# Altium schematic symbol library jlcpcb_2025_04_capacitors_extended_0402.schlib: 3594 symbols (part 9 of 20) (continued)
## CC0402KRX7R5BB104
designator C?  Capacitance: 100nF  (hidden comment: *)
Capacitor, Ceramic (MLCC), 100nF, ±10%, 6.3V, X7R, ±10%, SMD 0402; Manufacturer: YAGEO; Manufacturer Part Number: CC0402KRX7R5BB104; Package Size: 0402; JLCPCB Basic Part: No; JLCPCB Part Number: C541406; Supplier 1: LCSC; Category: Capacitors - MLCC; Supplier Part Number 1: C541406; Tolerance: ±10%; Voltage Rating: 6.3V; Temperature Coefficient: X7R; RoHS: Yes; ComponentLink1Description: Datasheet; ComponentLink1URL: https://wmsc.lcsc.com/wmsc/upload/file/pdf/v2/lcsc/2006151134_YAGEO-CC0402KRX7R5BB104_C541406.pdf; ComponentLink2Description: JLCPCB Part URL; ComponentLink2URL: https://jlcpcb.com/partdetail/C541406; ComponentLink3Description: LCSC Part URL; ComponentLink3URL: https://lcsc.com/product-detail/Multilayer-Ceramic-Capacitors-MLCC---SMD-SMT_YAGEO-YAGEO-CC0402KRX7R5BB104_C541406.html
footprint CAP-0402 (0402 (1005M) Capacitor)
pins: 1, 2

## CC0402KRX7R5BB105
designator C?  Capacitance: 1uF  (hidden comment: *)
Capacitor, Ceramic (MLCC), 1uF, ±10%, 6.3V, X7R, ±10%, SMD 0402; Manufacturer: YAGEO; Manufacturer Part Number: CC0402KRX7R5BB105; Package Size: 0402; JLCPCB Basic Part: No; JLCPCB Part Number: C115046; Supplier 1: LCSC; Category: Capacitors - MLCC; Supplier Part Number 1: C115046; Tolerance: ±10%; Voltage Rating: 6.3V; Temperature Coefficient: X7R; RoHS: Yes; ComponentLink1Description: Datasheet; ComponentLink1URL: https://wmsc.lcsc.com/wmsc/upload/file/pdf/v2/lcsc/2007151105_YAGEO-CC0402KRX7R5BB105_C115046.pdf; ComponentLink2Description: JLCPCB Part URL; ComponentLink2URL: https://jlcpcb.com/partdetail/C115046; ComponentLink3Description: LCSC Part URL; ComponentLink3URL: https://lcsc.com/product-detail/Multilayer-Ceramic-Capacitors-MLCC---SMD-SMT_YAGEO-YAGEO-CC0402KRX7R5BB105_C115046.html
footprint CAP-0402 (0402 (1005M) Capacitor)
pins: 1, 2

## CC0402KRX7R5BB474
designator C?  Capacitance: 470nF  (hidden comment: *)
Capacitor, Ceramic (MLCC), 470nF, ±10%, 6.3V, X7R, ±10%, SMD 0402; Manufacturer: YAGEO; Manufacturer Part Number: CC0402KRX7R5BB474; Package Size: 0402; JLCPCB Basic Part: No; JLCPCB Part Number: C2960663; Supplier 1: LCSC; Category: Capacitors - MLCC; Supplier Part Number 1: C2960663; Tolerance: ±10%; Voltage Rating: 6.3V; Temperature Coefficient: X7R; RoHS: Yes; ComponentLink1Description: Datasheet; ComponentLink1URL: https://wmsc.lcsc.com/wmsc/upload/file/pdf/v2/lcsc/2201201730_YAGEO-CC0402KRX7R5BB474_C2960663.pdf; ComponentLink2Description: JLCPCB Part URL; ComponentLink2URL: https://jlcpcb.com/partdetail/C2960663; ComponentLink3Description: LCSC Part URL; ComponentLink3URL: https://lcsc.com/product-detail/Multilayer-Ceramic-Capacitors-MLCC---SMD-SMT_YAGEO-YAGEO-CC0402KRX7R5BB474_C2960663.html
footprint CAP-0402 (0402 (1005M) Capacitor)
pins: 1, 2

## CC0402KRX7R6BB103
designator C?  Capacitance: 10nF  (hidden comment: *)
Capacitor, Ceramic (MLCC), 10nF, ±10%, 10V, X7R, ±10%, SMD 0402; Manufacturer: YAGEO; Manufacturer Part Number: CC0402KRX7R6BB103; Package Size: 0402; JLCPCB Basic Part: No; JLCPCB Part Number: C541371; Supplier 1: LCSC; Category: Capacitors - MLCC; Supplier Part Number 1: C541371; Tolerance: ±10%; Voltage Rating: 10V; Temperature Coefficient: X7R; RoHS: Yes; ComponentLink1Description: Datasheet; ComponentLink1URL: https://wmsc.lcsc.com/wmsc/upload/file/pdf/v2/lcsc/2006151112_YAGEO-CC0402KRX7R6BB103_C541371.pdf; ComponentLink2Description: JLCPCB Part URL; ComponentLink2URL: https://jlcpcb.com/partdetail/C541371; ComponentLink3Description: LCSC Part URL; ComponentLink3URL: https://lcsc.com/product-detail/Multilayer-Ceramic-Capacitors-MLCC---SMD-SMT_YAGEO-YAGEO-CC0402KRX7R6BB103_C541371.html
footprint CAP-0402 (0402 (1005M) Capacitor)
pins: 1, 2

## CC0402KRX7R6BB104
designator C?  Capacitance: 100nF  (hidden comment: *)
Capacitor, Ceramic (MLCC), 100nF, ±10%, 10V, X7R, ±10%, SMD 0402; Manufacturer: YAGEO; Manufacturer Part Number: CC0402KRX7R6BB104; Package Size: 0402; JLCPCB Basic Part: No; JLCPCB Part Number: C309458; Supplier 1: LCSC; Category: Capacitors - MLCC; Supplier Part Number 1: C309458; Tolerance: ±10%; Voltage Rating: 10V; Temperature Coefficient: X7R; RoHS: Yes; ComponentLink1Description: Datasheet; ComponentLink1URL: https://wmsc.lcsc.com/wmsc/upload/file/pdf/v2/lcsc/2304140030_YAGEO-CC0402KRX7R6BB104_C309458.pdf; ComponentLink2Description: JLCPCB Part URL; ComponentLink2URL: https://jlcpcb.com/partdetail/C309458; ComponentLink3Description: LCSC Part URL; ComponentLink3URL: https://lcsc.com/product-detail/Multilayer-Ceramic-Capacitors-MLCC---SMD-SMT_YAGEO-YAGEO-CC0402KRX7R6BB104_C309458.html
footprint CAP-0402 (0402 (1005M) Capacitor)
pins: 1, 2

## CC0402KRX7R6BB105
designator C?  Capacitance: 1uF  (hidden comment: *)
Capacitor, Ceramic (MLCC), 1uF, ±10%, 10V, X7R, ±10%, SMD 0402; Manufacturer: YAGEO; Manufacturer Part Number: CC0402KRX7R6BB105; Package Size: 0402; JLCPCB Basic Part: No; JLCPCB Part Number: C7500381; Supplier 1: LCSC; Category: Capacitors - MLCC; Supplier Part Number 1: C7500381; Tolerance: ±10%; Voltage Rating: 10V; Temperature Coefficient: X7R; RoHS: Yes; ComponentLink1Description: Datasheet; ComponentLink1URL: https://wmsc.lcsc.com/wmsc/upload/file/pdf/v2/lcsc/2311211121_YAGEO-CC0402KRX7R6BB105_C7500381.pdf; ComponentLink2Description: JLCPCB Part URL; ComponentLink2URL: https://jlcpcb.com/partdetail/C7500381; ComponentLink3Description: LCSC Part URL; ComponentLink3URL: https://lcsc.com/product-detail/Multilayer-Ceramic-Capacitors-MLCC---SMD-SMT_YAGEO-YAGEO-CC0402KRX7R6BB105_C7500381.html
footprint CAP-0402 (0402 (1005M) Capacitor)
pins: 1, 2

## CC0402KRX7R6BB222
designator C?  Capacitance: 2.2nF  (hidden comment: *)
Capacitor, Ceramic (MLCC), 2.2nF, ±10%, 10V, X7R, ±10%, SMD 0402; Manufacturer: YAGEO; Manufacturer Part Number: CC0402KRX7R6BB222; Package Size: 0402; JLCPCB Basic Part: No; JLCPCB Part Number: C541373; Supplier 1: LCSC; Category: Capacitors - MLCC; Supplier Part Number 1: C541373; Tolerance: ±10%; Voltage Rating: 10V; Temperature Coefficient: X7R; RoHS: Yes; ComponentLink1Description: Datasheet; ComponentLink1URL: https://wmsc.lcsc.com/wmsc/upload/file/pdf/v2/lcsc/2006151112_YAGEO-CC0402KRX7R6BB222_C541373.pdf; ComponentLink2Description: JLCPCB Part URL; ComponentLink2URL: https://jlcpcb.com/partdetail/C541373; ComponentLink3Description: LCSC Part URL; ComponentLink3URL: https://lcsc.com/product-detail/Multilayer-Ceramic-Capacitors-MLCC---SMD-SMT_YAGEO-YAGEO-CC0402KRX7R6BB222_C541373.html
footprint CAP-0402 (0402 (1005M) Capacitor)
pins: 1, 2

## CC0402KRX7R6BB223
designator C?  Capacitance: 22nF  (hidden comment: *)
Capacitor, Ceramic (MLCC), 22nF, ±10%, 10V, X7R, ±10%, SMD 0402; Manufacturer: YAGEO; Manufacturer Part Number: CC0402KRX7R6BB223; Package Size: 0402; JLCPCB Basic Part: No; JLCPCB Part Number: C541403; Supplier 1: LCSC; Category: Capacitors - MLCC; Supplier Part Number 1: C541403; Tolerance: ±10%; Voltage Rating: 10V; Temperature Coefficient: X7R; RoHS: Yes; ComponentLink1Description: Datasheet; ComponentLink1URL: https://wmsc.lcsc.com/wmsc/upload/file/pdf/v2/lcsc/2006151133_YAGEO-CC0402KRX7R6BB223_C541403.pdf; ComponentLink2Description: JLCPCB Part URL; ComponentLink2URL: https://jlcpcb.com/partdetail/C541403; ComponentLink3Description: LCSC Part URL; ComponentLink3URL: https://lcsc.com/product-detail/Multilayer-Ceramic-Capacitors-MLCC---SMD-SMT_YAGEO-YAGEO-CC0402KRX7R6BB223_C541403.html
footprint CAP-0402 (0402 (1005M) Capacitor)
pins: 1, 2

## CC0402KRX7R6BB224
designator C?  Capacitance: 220nF  (hidden comment: *)
Capacitor, Ceramic (MLCC), 220nF, ±10%, 10V, X7R, ±10%, SMD 0402; Manufacturer: YAGEO; Manufacturer Part Number: CC0402KRX7R6BB224; Package Size: 0402; JLCPCB Basic Part: No; JLCPCB Part Number: C705052; Supplier 1: LCSC; Category: Capacitors - MLCC; Supplier Part Number 1: C705052; Tolerance: ±10%; Voltage Rating: 10V; Temperature Coefficient: X7R; RoHS: Yes; ComponentLink1Description: Datasheet; ComponentLink1URL: https://wmsc.lcsc.com/wmsc/upload/file/pdf/v2/lcsc/2007202033_YAGEO-CC0402KRX7R6BB224_C705052.pdf; ComponentLink2Description: JLCPCB Part URL; ComponentLink2URL: https://jlcpcb.com/partdetail/C705052; ComponentLink3Description: LCSC Part URL; ComponentLink3URL: https://lcsc.com/product-detail/Multilayer-Ceramic-Capacitors-MLCC---SMD-SMT_YAGEO-YAGEO-CC0402KRX7R6BB224_C705052.html
footprint CAP-0402 (0402 (1005M) Capacitor)
pins: 1, 2

## CC0402KRX7R6BB273
designator C?  Capacitance: 27nF  (hidden comment: *)
Capacitor, Ceramic (MLCC), 27nF, ±10%, 10V, X7R, ±10%, SMD 0402; Manufacturer: YAGEO; Manufacturer Part Number: CC0402KRX7R6BB273; Package Size: 0402; JLCPCB Basic Part: No; JLCPCB Part Number: C327166; Supplier 1: LCSC; Category: Capacitors - MLCC; Supplier Part Number 1: C327166; Tolerance: ±10%; Voltage Rating: 10V; Temperature Coefficient: X7R; RoHS: Yes; ComponentLink1Description: Datasheet; ComponentLink1URL: https://wmsc.lcsc.com/wmsc/upload/file/pdf/v2/lcsc/1811141225_YAGEO-CC0402KRX7R6BB273_C327166.pdf; ComponentLink2Description: JLCPCB Part URL; ComponentLink2URL: https://jlcpcb.com/partdetail/C327166; ComponentLink3Description: LCSC Part URL; ComponentLink3URL: https://lcsc.com/product-detail/Multilayer-Ceramic-Capacitors-MLCC---SMD-SMT_YAGEO-YAGEO-CC0402KRX7R6BB273_C327166.html
footprint CAP-0402 (0402 (1005M) Capacitor)
pins: 1, 2

## CC0402KRX7R6BB333
designator C?  Capacitance: 33nF  (hidden comment: *)
Capacitor, Ceramic (MLCC), 33nF, ±10%, 10V, X7R, ±10%, SMD 0402; Manufacturer: YAGEO; Manufacturer Part Number: CC0402KRX7R6BB333; Package Size: 0402; JLCPCB Basic Part: No; JLCPCB Part Number: C541404; Supplier 1: LCSC; Category: Capacitors - MLCC; Supplier Part Number 1: C541404; Tolerance: ±10%; Voltage Rating: 10V; Temperature Coefficient: X7R; RoHS: Yes; ComponentLink1Description: Datasheet; ComponentLink1URL: https://wmsc.lcsc.com/wmsc/upload/file/pdf/v2/lcsc/2006151133_YAGEO-CC0402KRX7R6BB333_C541404.pdf; ComponentLink2Description: JLCPCB Part URL; ComponentLink2URL: https://jlcpcb.com/partdetail/C541404; ComponentLink3Description: LCSC Part URL; ComponentLink3URL: https://lcsc.com/product-detail/Multilayer-Ceramic-Capacitors-MLCC---SMD-SMT_YAGEO-YAGEO-CC0402KRX7R6BB333_C541404.html
footprint CAP-0402 (0402 (1005M) Capacitor)
pins: 1, 2

## CC0402KRX7R6BB393
designator C?  Capacitance: 39nF  (hidden comment: *)
Capacitor, Ceramic (MLCC), 39nF, ±10%, 10V, X7R, ±10%, SMD 0402; Manufacturer: YAGEO; Manufacturer Part Number: CC0402KRX7R6BB393; Package Size: 0402; JLCPCB Basic Part: No; JLCPCB Part Number: C527015; Supplier 1: LCSC; Category: Capacitors - MLCC; Supplier Part Number 1: C527015; Tolerance: ±10%; Voltage Rating: 10V; Temperature Coefficient: X7R; RoHS: Yes; ComponentLink1Description: Datasheet; ComponentLink1URL: https://wmsc.lcsc.com/wmsc/upload/file/pdf/v2/lcsc/2006031835_YAGEO-CC0402KRX7R6BB393_C527015.pdf; ComponentLink2Description: JLCPCB Part URL; ComponentLink2URL: https://jlcpcb.com/partdetail/C527015; ComponentLink3Description: LCSC Part URL; ComponentLink3URL: https://lcsc.com/product-detail/Multilayer-Ceramic-Capacitors-MLCC---SMD-SMT_YAGEO-YAGEO-CC0402KRX7R6BB393_C527015.html
footprint CAP-0402 (0402 (1005M) Capacitor)
pins: 1, 2

## CC0402KRX7R6BB472
designator C?  Capacitance: 4.7nF  (hidden comment: *)
Capacitor, Ceramic (MLCC), 4.7nF, ±10%, 10V, X7R, ±10%, SMD 0402; Manufacturer: YAGEO; Manufacturer Part Number: CC0402KRX7R6BB472; Package Size: 0402; JLCPCB Basic Part: No; JLCPCB Part Number: C1852867; Supplier 1: LCSC; Category: Capacitors - MLCC; Supplier Part Number 1: C1852867; Tolerance: ±10%; Voltage Rating: 10V; Temperature Coefficient: X7R; RoHS: Yes; ComponentLink1Description: Datasheet; ComponentLink1URL: https://wmsc.lcsc.com/wmsc/upload/file/pdf/v2/lcsc/2201271000_YAGEO-CC0402KRX7R6BB472_C1852867.pdf; ComponentLink2Description: JLCPCB Part URL; ComponentLink2URL: https://jlcpcb.com/partdetail/C1852867; ComponentLink3Description: LCSC Part URL; ComponentLink3URL: https://lcsc.com/product-detail/Multilayer-Ceramic-Capacitors-MLCC---SMD-SMT_YAGEO-YAGEO-CC0402KRX7R6BB472_C1852867.html
footprint CAP-0402 (0402 (1005M) Capacitor)
pins: 1, 2

## CC0402KRX7R6BB473
designator C?  Capacitance: 47nF  (hidden comment: *)
Capacitor, Ceramic (MLCC), 47nF, ±10%, 10V, X7R, ±10%, SMD 0402; Manufacturer: YAGEO; Manufacturer Part Number: CC0402KRX7R6BB473; Package Size: 0402; JLCPCB Basic Part: No; JLCPCB Part Number: C327054; Supplier 1: LCSC; Category: Capacitors - MLCC; Supplier Part Number 1: C327054; Tolerance: ±10%; Voltage Rating: 10V; Temperature Coefficient: X7R; RoHS: Yes; ComponentLink1Description: Datasheet; ComponentLink1URL: https://wmsc.lcsc.com/wmsc/upload/file/pdf/v2/lcsc/1811141233_YAGEO-CC0402KRX7R6BB473_C327054.pdf; ComponentLink2Description: JLCPCB Part URL; ComponentLink2URL: https://jlcpcb.com/partdetail/C327054; ComponentLink3Description: LCSC Part URL; ComponentLink3URL: https://lcsc.com/product-detail/Multilayer-Ceramic-Capacitors-MLCC---SMD-SMT_YAGEO-YAGEO-CC0402KRX7R6BB473_C327054.html
footprint CAP-0402 (0402 (1005M) Capacitor)
pins: 1, 2

## CC0402KRX7R6BB474
designator C?  Capacitance: 470nF  (hidden comment: *)
Capacitor, Ceramic (MLCC), 470nF, ±10%, 10V, X7R, ±10%, SMD 0402; Manufacturer: YAGEO; Manufacturer Part Number: CC0402KRX7R6BB474; Package Size: 0402; JLCPCB Basic Part: No; JLCPCB Part Number: C723358; Supplier 1: LCSC; Category: Capacitors - MLCC; Supplier Part Number 1: C723358; Tolerance: ±10%; Voltage Rating: 10V; Temperature Coefficient: X7R; RoHS: Yes; ComponentLink1Description: Datasheet; ComponentLink1URL: https://wmsc.lcsc.com/wmsc/upload/file/pdf/v2/lcsc/2204291430_YAGEO-CC0402KRX7R6BB474_C723358.pdf; ComponentLink2Description: JLCPCB Part URL; ComponentLink2URL: https://jlcpcb.com/partdetail/C723358; ComponentLink3Description: LCSC Part URL; ComponentLink3URL: https://lcsc.com/product-detail/Multilayer-Ceramic-Capacitors-MLCC---SMD-SMT_YAGEO-YAGEO-CC0402KRX7R6BB474_C723358.html
footprint CAP-0402 (0402 (1005M) Capacitor)
pins: 1, 2

## CC0402KRX7R6BB563
designator C?  Capacitance: 56nF  (hidden comment: *)
Capacitor, Ceramic (MLCC), 56nF, ±10%, 10V, X7R, ±10%, SMD 0402; Manufacturer: YAGEO; Manufacturer Part Number: CC0402KRX7R6BB563; Package Size: 0402; JLCPCB Basic Part: No; JLCPCB Part Number: C576734; Supplier 1: LCSC; Category: Capacitors - MLCC; Supplier Part Number 1: C576734; Tolerance: ±10%; Voltage Rating: 10V; Temperature Coefficient: X7R; RoHS: Yes; ComponentLink1Description: Datasheet; ComponentLink1URL: https://wmsc.lcsc.com/wmsc/upload/file/pdf/v2/lcsc/2008171233_YAGEO-CC0402KRX7R6BB563_C576734.pdf; ComponentLink2Description: JLCPCB Part URL; ComponentLink2URL: https://jlcpcb.com/partdetail/C576734; ComponentLink3Description: LCSC Part URL; ComponentLink3URL: https://lcsc.com/product-detail/Multilayer-Ceramic-Capacitors-MLCC---SMD-SMT_YAGEO-YAGEO-CC0402KRX7R6BB563_C576734.html
footprint CAP-0402 (0402 (1005M) Capacitor)
pins: 1, 2

## CC0402KRX7R6BB683
designator C?  Capacitance: 68nF  (hidden comment: *)
Capacitor, Ceramic (MLCC), 68nF, ±10%, 10V, X7R, ±10%, SMD 0402; Manufacturer: YAGEO; Manufacturer Part Number: CC0402KRX7R6BB683; Package Size: 0402; JLCPCB Basic Part: No; JLCPCB Part Number: C107014; Supplier 1: LCSC; Category: Capacitors - MLCC; Supplier Part Number 1: C107014; Tolerance: ±10%; Voltage Rating: 10V; Temperature Coefficient: X7R; RoHS: Yes; ComponentLink1Description: Datasheet; ComponentLink1URL: https://wmsc.lcsc.com/wmsc/upload/file/pdf/v2/lcsc/2304140030_YAGEO-CC0402KRX7R6BB683_C107014.pdf; ComponentLink2Description: JLCPCB Part URL; ComponentLink2URL: https://jlcpcb.com/partdetail/C107014; ComponentLink3Description: LCSC Part URL; ComponentLink3URL: https://lcsc.com/product-detail/Multilayer-Ceramic-Capacitors-MLCC---SMD-SMT_YAGEO-YAGEO-CC0402KRX7R6BB683_C107014.html
footprint CAP-0402 (0402 (1005M) Capacitor)
pins: 1, 2

## CC0402KRX7R6BB823
designator C?  Capacitance: 82nF  (hidden comment: *)
Capacitor, Ceramic (MLCC), 82nF, ±10%, 10V, X7R, ±10%, SMD 0402; Manufacturer: YAGEO; Manufacturer Part Number: CC0402KRX7R6BB823; Package Size: 0402; JLCPCB Basic Part: No; JLCPCB Part Number: C277511; Supplier 1: LCSC; Category: Capacitors - MLCC; Supplier Part Number 1: C277511; Tolerance: ±10%; Voltage Rating: 10V; Temperature Coefficient: X7R; RoHS: Yes; ComponentLink1Description: Datasheet; ComponentLink1URL: https://wmsc.lcsc.com/wmsc/upload/file/pdf/v2/lcsc/2304140030_YAGEO-CC0402KRX7R6BB823_C277511.pdf; ComponentLink2Description: JLCPCB Part URL; ComponentLink2URL: https://jlcpcb.com/partdetail/C277511; ComponentLink3Description: LCSC Part URL; ComponentLink3URL: https://lcsc.com/product-detail/Multilayer-Ceramic-Capacitors-MLCC---SMD-SMT_YAGEO-YAGEO-CC0402KRX7R6BB823_C277511.html
footprint CAP-0402 (0402 (1005M) Capacitor)
pins: 1, 2

## CC0402KRX7R7BB101
designator C?  Capacitance: 100pF  (hidden comment: *)
Capacitor, Ceramic (MLCC), 100pF, ±10%, 16V, X7R, ±10%, SMD 0402; Manufacturer: YAGEO; Manufacturer Part Number: CC0402KRX7R7BB101; Package Size: 0402; JLCPCB Basic Part: No; JLCPCB Part Number: C541374; Supplier 1: LCSC; Category: Capacitors - MLCC; Supplier Part Number 1: C541374; Tolerance: ±10%; Voltage Rating: 16V; Temperature Coefficient: X7R; RoHS: Yes; ComponentLink1Description: Datasheet; ComponentLink1URL: https://wmsc.lcsc.com/wmsc/upload/file/pdf/v2/lcsc/2006151112_YAGEO-CC0402KRX7R7BB101_C541374.pdf; ComponentLink2Description: JLCPCB Part URL; ComponentLink2URL: https://jlcpcb.com/partdetail/C541374; ComponentLink3Description: LCSC Part URL; ComponentLink3URL: https://lcsc.com/product-detail/Multilayer-Ceramic-Capacitors-MLCC---SMD-SMT_YAGEO-YAGEO-CC0402KRX7R7BB101_C541374.html
footprint CAP-0402 (0402 (1005M) Capacitor)
pins: 1, 2

## CC0402KRX7R7BB102
designator C?  Capacitance: 1nF  (hidden comment: *)
Capacitor, Ceramic (MLCC), 1nF, ±10%, 16V, X7R, ±10%, SMD 0402; Manufacturer: YAGEO; Manufacturer Part Number: CC0402KRX7R7BB102; Package Size: 0402; JLCPCB Basic Part: No; JLCPCB Part Number: C189467; Supplier 1: LCSC; Category: Capacitors - MLCC; Supplier Part Number 1: C189467; Tolerance: ±10%; Voltage Rating: 16V; Temperature Coefficient: X7R; RoHS: Yes; ComponentLink1Description: Datasheet; ComponentLink1URL: https://wmsc.lcsc.com/wmsc/upload/file/pdf/v2/lcsc/1810241333_YAGEO-CC0402KRX7R7BB102_C189467.pdf; ComponentLink2Description: JLCPCB Part URL; ComponentLink2URL: https://jlcpcb.com/partdetail/C189467; ComponentLink3Description: LCSC Part URL; ComponentLink3URL: https://lcsc.com/product-detail/Multilayer-Ceramic-Capacitors-MLCC---SMD-SMT_YAGEO-YAGEO-CC0402KRX7R7BB102_C189467.html
footprint CAP-0402 (0402 (1005M) Capacitor)
pins: 1, 2

## CC0402KRX7R7BB103
designator C?  Capacitance: 10nF  (hidden comment: *)
Capacitor, Ceramic (MLCC), 10nF, ±10%, 16V, X7R, ±10%, SMD 0402; Manufacturer: YAGEO; Manufacturer Part Number: CC0402KRX7R7BB103; Package Size: 0402; JLCPCB Basic Part: No; JLCPCB Part Number: C327009; Supplier 1: LCSC; Category: Capacitors - MLCC; Supplier Part Number 1: C327009; Tolerance: ±10%; Voltage Rating: 16V; Temperature Coefficient: X7R; RoHS: Yes; ComponentLink1Description: Datasheet; ComponentLink1URL: https://wmsc.lcsc.com/wmsc/upload/file/pdf/v2/lcsc/1811141241_YAGEO-CC0402KRX7R7BB103_C327009.pdf; ComponentLink2Description: JLCPCB Part URL; ComponentLink2URL: https://jlcpcb.com/partdetail/C327009; ComponentLink3Description: LCSC Part URL; ComponentLink3URL: https://lcsc.com/product-detail/Multilayer-Ceramic-Capacitors-MLCC---SMD-SMT_YAGEO-YAGEO-CC0402KRX7R7BB103_C327009.html
footprint CAP-0402 (0402 (1005M) Capacitor)
pins: 1, 2

## CC0402KRX7R7BB104
designator C?  Capacitance: 100nF  (hidden comment: *)
Capacitor, Ceramic (MLCC), 100nF, ±10%, 16V, X7R, ±10%, SMD 0402; Manufacturer: YAGEO; Manufacturer Part Number: CC0402KRX7R7BB104; Package Size: 0402; JLCPCB Basic Part: No; JLCPCB Part Number: C60474; Supplier 1: LCSC; Category: Capacitors - MLCC; Supplier Part Number 1: C60474; Tolerance: ±10%; Voltage Rating: 16V; Temperature Coefficient: X7R; RoHS: Yes; ComponentLink1Description: Datasheet; ComponentLink1URL: https://wmsc.lcsc.com/wmsc/upload/file/pdf/v2/lcsc/2203221430_YAGEO-CC0402KRX7R7BB104_C60474.pdf; ComponentLink2Description: JLCPCB Part URL; ComponentLink2URL: https://jlcpcb.com/partdetail/C60474; ComponentLink3Description: LCSC Part URL; ComponentLink3URL: https://lcsc.com/product-detail/Multilayer-Ceramic-Capacitors-MLCC---SMD-SMT_YAGEO-YAGEO-CC0402KRX7R7BB104_C60474.html
footprint CAP-0402 (0402 (1005M) Capacitor)
pins: 1, 2

## CC0402KRX7R7BB123
designator C?  Capacitance: 12nF  (hidden comment: *)
Capacitor, Ceramic (MLCC), 12nF, ±10%, 16V, X7R, ±10%, SMD 0402; Manufacturer: YAGEO; Manufacturer Part Number: CC0402KRX7R7BB123; Package Size: 0402; JLCPCB Basic Part: No; JLCPCB Part Number: C113785; Supplier 1: LCSC; Category: Capacitors - MLCC; Supplier Part Number 1: C113785; Tolerance: ±10%; Voltage Rating: 16V; Temperature Coefficient: X7R; RoHS: Yes; ComponentLink1Description: Datasheet; ComponentLink1URL: https://wmsc.lcsc.com/wmsc/upload/file/pdf/v2/lcsc/2304140030_YAGEO-CC0402KRX7R7BB123_C113785.pdf; ComponentLink2Description: JLCPCB Part URL; ComponentLink2URL: https://jlcpcb.com/partdetail/C113785; ComponentLink3Description: LCSC Part URL; ComponentLink3URL: https://lcsc.com/product-detail/Multilayer-Ceramic-Capacitors-MLCC---SMD-SMT_YAGEO-YAGEO-CC0402KRX7R7BB123_C113785.html
footprint CAP-0402 (0402 (1005M) Capacitor)
pins: 1, 2

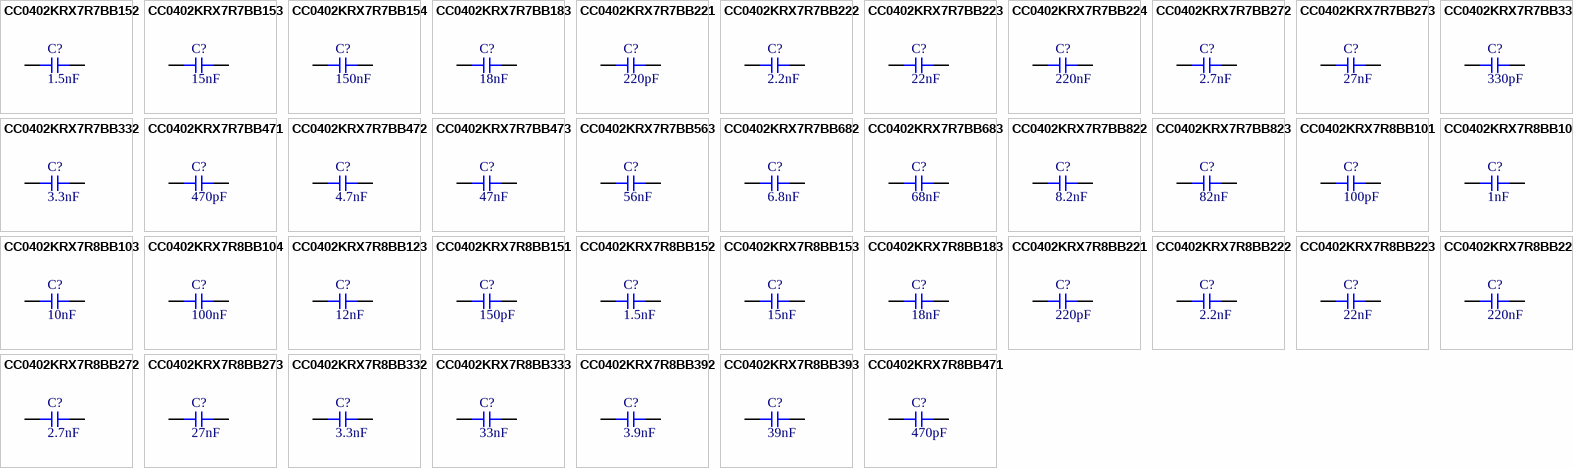
[diagram p39: symbols CC0402KRX7R7BB152 to CC0402KRX7R8BB471]

## CC0402KRX7R7BB152
designator C?  Capacitance: 1.5nF  (hidden comment: *)
Capacitor, Ceramic (MLCC), 1.5nF, ±10%, 16V, X7R, ±10%, SMD 0402; Manufacturer: YAGEO; Manufacturer Part Number: CC0402KRX7R7BB152; Package Size: 0402; JLCPCB Basic Part: No; JLCPCB Part Number: C541375; Supplier 1: LCSC; Category: Capacitors - MLCC; Supplier Part Number 1: C541375; Tolerance: ±10%; Voltage Rating: 16V; Temperature Coefficient: X7R; RoHS: Yes; ComponentLink1Description: Datasheet; ComponentLink1URL: https://wmsc.lcsc.com/wmsc/upload/file/pdf/v2/lcsc/2006151112_YAGEO-CC0402KRX7R7BB152_C541375.pdf; ComponentLink2Description: JLCPCB Part URL; ComponentLink2URL: https://jlcpcb.com/partdetail/C541375; ComponentLink3Description: LCSC Part URL; ComponentLink3URL: https://lcsc.com/product-detail/Multilayer-Ceramic-Capacitors-MLCC---SMD-SMT_YAGEO-YAGEO-CC0402KRX7R7BB152_C541375.html
footprint CAP-0402 (0402 (1005M) Capacitor)
pins: 1, 2

## CC0402KRX7R7BB153
designator C?  Capacitance: 15nF  (hidden comment: *)
Capacitor, Ceramic (MLCC), 15nF, ±10%, 16V, X7R, ±10%, SMD 0402; Manufacturer: YAGEO; Manufacturer Part Number: CC0402KRX7R7BB153; Package Size: 0402; JLCPCB Basic Part: No; JLCPCB Part Number: C107015; Supplier 1: LCSC; Category: Capacitors - MLCC; Supplier Part Number 1: C107015; Tolerance: ±10%; Voltage Rating: 16V; Temperature Coefficient: X7R; RoHS: Yes; ComponentLink1Description: Datasheet; ComponentLink1URL: https://wmsc.lcsc.com/wmsc/upload/file/pdf/v2/lcsc/2304140030_YAGEO-CC0402KRX7R7BB153_C107015.pdf; ComponentLink2Description: JLCPCB Part URL; ComponentLink2URL: https://jlcpcb.com/partdetail/C107015; ComponentLink3Description: LCSC Part URL; ComponentLink3URL: https://lcsc.com/product-detail/Multilayer-Ceramic-Capacitors-MLCC---SMD-SMT_YAGEO-YAGEO-CC0402KRX7R7BB153_C107015.html
footprint CAP-0402 (0402 (1005M) Capacitor)
pins: 1, 2

## CC0402KRX7R7BB154
designator C?  Capacitance: 150nF  (hidden comment: *)
Capacitor, Ceramic (MLCC), 150nF, ±10%, 16V, X7R, ±10%, SMD 0402; Manufacturer: YAGEO; Manufacturer Part Number: CC0402KRX7R7BB154; Package Size: 0402; JLCPCB Basic Part: No; JLCPCB Part Number: C505466; Supplier 1: LCSC; Category: Capacitors - MLCC; Supplier Part Number 1: C505466; Tolerance: ±10%; Voltage Rating: 16V; Temperature Coefficient: X7R; RoHS: Yes; ComponentLink1Description: Datasheet; ComponentLink1URL: https://wmsc.lcsc.com/wmsc/upload/file/pdf/v2/lcsc/2304140030_YAGEO-CC0402KRX7R7BB154_C505466.pdf; ComponentLink2Description: JLCPCB Part URL; ComponentLink2URL: https://jlcpcb.com/partdetail/C505466; ComponentLink3Description: LCSC Part URL; ComponentLink3URL: https://lcsc.com/product-detail/Multilayer-Ceramic-Capacitors-MLCC---SMD-SMT_YAGEO-YAGEO-CC0402KRX7R7BB154_C505466.html
footprint CAP-0402 (0402 (1005M) Capacitor)
pins: 1, 2

## CC0402KRX7R7BB183
designator C?  Capacitance: 18nF  (hidden comment: *)
Capacitor, Ceramic (MLCC), 18nF, ±10%, 16V, X7R, ±10%, SMD 0402; Manufacturer: YAGEO; Manufacturer Part Number: CC0402KRX7R7BB183; Package Size: 0402; JLCPCB Basic Part: No; JLCPCB Part Number: C107016; Supplier 1: LCSC; Category: Capacitors - MLCC; Supplier Part Number 1: C107016; Tolerance: ±10%; Voltage Rating: 16V; Temperature Coefficient: X7R; RoHS: Yes; ComponentLink1Description: Datasheet; ComponentLink1URL: https://wmsc.lcsc.com/wmsc/upload/file/pdf/v2/lcsc/2304140030_YAGEO-CC0402KRX7R7BB183_C107016.pdf; ComponentLink2Description: JLCPCB Part URL; ComponentLink2URL: https://jlcpcb.com/partdetail/C107016; ComponentLink3Description: LCSC Part URL; ComponentLink3URL: https://lcsc.com/product-detail/Multilayer-Ceramic-Capacitors-MLCC---SMD-SMT_YAGEO-YAGEO-CC0402KRX7R7BB183_C107016.html
footprint CAP-0402 (0402 (1005M) Capacitor)
pins: 1, 2

## CC0402KRX7R7BB221
designator C?  Capacitance: 220pF  (hidden comment: *)
Capacitor, Ceramic (MLCC), 220pF, ±10%, 16V, X7R, ±10%, SMD 0402; Manufacturer: YAGEO; Manufacturer Part Number: CC0402KRX7R7BB221; Package Size: 0402; JLCPCB Basic Part: No; JLCPCB Part Number: C327000; Supplier 1: LCSC; Category: Capacitors - MLCC; Supplier Part Number 1: C327000; Tolerance: ±10%; Voltage Rating: 16V; Temperature Coefficient: X7R; RoHS: Yes; ComponentLink1Description: Datasheet; ComponentLink1URL: https://wmsc.lcsc.com/wmsc/upload/file/pdf/v2/lcsc/2311211121_YAGEO-CC0402KRX7R7BB221_C327000.pdf; ComponentLink2Description: JLCPCB Part URL; ComponentLink2URL: https://jlcpcb.com/partdetail/C327000; ComponentLink3Description: LCSC Part URL; ComponentLink3URL: https://lcsc.com/product-detail/Multilayer-Ceramic-Capacitors-MLCC---SMD-SMT_YAGEO-YAGEO-CC0402KRX7R7BB221_C327000.html
footprint CAP-0402 (0402 (1005M) Capacitor)
pins: 1, 2

## CC0402KRX7R7BB222
designator C?  Capacitance: 2.2nF  (hidden comment: *)
Capacitor, Ceramic (MLCC), 2.2nF, ±10%, 16V, X7R, ±10%, SMD 0402; Manufacturer: YAGEO; Manufacturer Part Number: CC0402KRX7R7BB222; Package Size: 0402; JLCPCB Basic Part: No; JLCPCB Part Number: C541376; Supplier 1: LCSC; Category: Capacitors - MLCC; Supplier Part Number 1: C541376; Tolerance: ±10%; Voltage Rating: 16V; Temperature Coefficient: X7R; RoHS: Yes; ComponentLink1Description: Datasheet; ComponentLink1URL: https://wmsc.lcsc.com/wmsc/upload/file/pdf/v2/lcsc/2006151112_YAGEO-CC0402KRX7R7BB222_C541376.pdf; ComponentLink2Description: JLCPCB Part URL; ComponentLink2URL: https://jlcpcb.com/partdetail/C541376; ComponentLink3Description: LCSC Part URL; ComponentLink3URL: https://lcsc.com/product-detail/Multilayer-Ceramic-Capacitors-MLCC---SMD-SMT_YAGEO-YAGEO-CC0402KRX7R7BB222_C541376.html
footprint CAP-0402 (0402 (1005M) Capacitor)
pins: 1, 2

## CC0402KRX7R7BB223
designator C?  Capacitance: 22nF  (hidden comment: *)
Capacitor, Ceramic (MLCC), 22nF, ±10%, 16V, X7R, ±10%, SMD 0402; Manufacturer: YAGEO; Manufacturer Part Number: CC0402KRX7R7BB223; Package Size: 0402; JLCPCB Basic Part: No; JLCPCB Part Number: C107017; Supplier 1: LCSC; Category: Capacitors - MLCC; Supplier Part Number 1: C107017; Tolerance: ±10%; Voltage Rating: 16V; Temperature Coefficient: X7R; RoHS: Yes; ComponentLink1Description: Datasheet; ComponentLink1URL: https://wmsc.lcsc.com/wmsc/upload/file/pdf/v2/lcsc/2304140030_YAGEO-CC0402KRX7R7BB223_C107017.pdf; ComponentLink2Description: JLCPCB Part URL; ComponentLink2URL: https://jlcpcb.com/partdetail/C107017; ComponentLink3Description: LCSC Part URL; ComponentLink3URL: https://lcsc.com/product-detail/Multilayer-Ceramic-Capacitors-MLCC---SMD-SMT_YAGEO-YAGEO-CC0402KRX7R7BB223_C107017.html
footprint CAP-0402 (0402 (1005M) Capacitor)
pins: 1, 2

## CC0402KRX7R7BB224
designator C?  Capacitance: 220nF  (hidden comment: *)
Capacitor, Ceramic (MLCC), 220nF, ±10%, 16V, X7R, ±10%, SMD 0402; Manufacturer: YAGEO; Manufacturer Part Number: CC0402KRX7R7BB224; Package Size: 0402; JLCPCB Basic Part: No; JLCPCB Part Number: C326590; Supplier 1: LCSC; Category: Capacitors - MLCC; Supplier Part Number 1: C326590; Tolerance: ±10%; Voltage Rating: 16V; Temperature Coefficient: X7R; RoHS: Yes; ComponentLink1Description: Datasheet; ComponentLink1URL: https://wmsc.lcsc.com/wmsc/upload/file/pdf/v2/lcsc/1811141242_YAGEO-CC0402KRX7R7BB224_C326590.pdf; ComponentLink2Description: JLCPCB Part URL; ComponentLink2URL: https://jlcpcb.com/partdetail/C326590; ComponentLink3Description: LCSC Part URL; ComponentLink3URL: https://lcsc.com/product-detail/Multilayer-Ceramic-Capacitors-MLCC---SMD-SMT_YAGEO-YAGEO-CC0402KRX7R7BB224_C326590.html
footprint CAP-0402 (0402 (1005M) Capacitor)
pins: 1, 2

## CC0402KRX7R7BB272
designator C?  Capacitance: 2.7nF  (hidden comment: *)
Capacitor, Ceramic (MLCC), 2.7nF, ±10%, 16V, X7R, ±10%, SMD 0402; Manufacturer: YAGEO; Manufacturer Part Number: CC0402KRX7R7BB272; Package Size: 0402; JLCPCB Basic Part: No; JLCPCB Part Number: C541389; Supplier 1: LCSC; Category: Capacitors - MLCC; Supplier Part Number 1: C541389; Tolerance: ±10%; Voltage Rating: 16V; Temperature Coefficient: X7R; RoHS: Yes; ComponentLink1Description: Datasheet; ComponentLink1URL: https://wmsc.lcsc.com/wmsc/upload/file/pdf/v2/lcsc/2006151133_YAGEO-CC0402KRX7R7BB272_C541389.pdf; ComponentLink2Description: JLCPCB Part URL; ComponentLink2URL: https://jlcpcb.com/partdetail/C541389; ComponentLink3Description: LCSC Part URL; ComponentLink3URL: https://lcsc.com/product-detail/Multilayer-Ceramic-Capacitors-MLCC---SMD-SMT_YAGEO-YAGEO-CC0402KRX7R7BB272_C541389.html
footprint CAP-0402 (0402 (1005M) Capacitor)
pins: 1, 2

## CC0402KRX7R7BB273
designator C?  Capacitance: 27nF  (hidden comment: *)
Capacitor, Ceramic (MLCC), 27nF, ±10%, 16V, X7R, ±10%, SMD 0402; Manufacturer: YAGEO; Manufacturer Part Number: CC0402KRX7R7BB273; Package Size: 0402; JLCPCB Basic Part: No; JLCPCB Part Number: C325465; Supplier 1: LCSC; Category: Capacitors - MLCC; Supplier Part Number 1: C325465; Tolerance: ±10%; Voltage Rating: 16V; Temperature Coefficient: X7R; RoHS: Yes; ComponentLink1Description: Datasheet; ComponentLink1URL: https://wmsc.lcsc.com/wmsc/upload/file/pdf/v2/lcsc/1811031143_YAGEO-CC0402KRX7R7BB273_C325465.pdf; ComponentLink2Description: JLCPCB Part URL; ComponentLink2URL: https://jlcpcb.com/partdetail/C325465; ComponentLink3Description: LCSC Part URL; ComponentLink3URL: https://lcsc.com/product-detail/Multilayer-Ceramic-Capacitors-MLCC---SMD-SMT_YAGEO-YAGEO-CC0402KRX7R7BB273_C325465.html
footprint CAP-0402 (0402 (1005M) Capacitor)
pins: 1, 2

## CC0402KRX7R7BB331
designator C?  Capacitance: 330pF  (hidden comment: *)
Capacitor, Ceramic (MLCC), 330pF, ±10%, 16V, X7R, ±10%, SMD 0402; Manufacturer: YAGEO; Manufacturer Part Number: CC0402KRX7R7BB331; Package Size: 0402; JLCPCB Basic Part: No; JLCPCB Part Number: C541377; Supplier 1: LCSC; Category: Capacitors - MLCC; Supplier Part Number 1: C541377; Tolerance: ±10%; Voltage Rating: 16V; Temperature Coefficient: X7R; RoHS: Yes; ComponentLink1Description: Datasheet; ComponentLink1URL: https://wmsc.lcsc.com/wmsc/upload/file/pdf/v2/lcsc/2006151112_YAGEO-CC0402KRX7R7BB331_C541377.pdf; ComponentLink2Description: JLCPCB Part URL; ComponentLink2URL: https://jlcpcb.com/partdetail/C541377; ComponentLink3Description: LCSC Part URL; ComponentLink3URL: https://lcsc.com/product-detail/Multilayer-Ceramic-Capacitors-MLCC---SMD-SMT_YAGEO-YAGEO-CC0402KRX7R7BB331_C541377.html
footprint CAP-0402 (0402 (1005M) Capacitor)
pins: 1, 2

## CC0402KRX7R7BB332
designator C?  Capacitance: 3.3nF  (hidden comment: *)
Capacitor, Ceramic (MLCC), 3.3nF, ±10%, 16V, X7R, ±10%, SMD 0402; Manufacturer: YAGEO; Manufacturer Part Number: CC0402KRX7R7BB332; Package Size: 0402; JLCPCB Basic Part: No; JLCPCB Part Number: C541378; Supplier 1: LCSC; Category: Capacitors - MLCC; Supplier Part Number 1: C541378; Tolerance: ±10%; Voltage Rating: 16V; Temperature Coefficient: X7R; RoHS: Yes; ComponentLink1Description: Datasheet; ComponentLink1URL: https://wmsc.lcsc.com/wmsc/upload/file/pdf/v2/lcsc/2006151112_YAGEO-CC0402KRX7R7BB332_C541378.pdf; ComponentLink2Description: JLCPCB Part URL; ComponentLink2URL: https://jlcpcb.com/partdetail/C541378; ComponentLink3Description: LCSC Part URL; ComponentLink3URL: https://lcsc.com/product-detail/Multilayer-Ceramic-Capacitors-MLCC---SMD-SMT_YAGEO-YAGEO-CC0402KRX7R7BB332_C541378.html
footprint CAP-0402 (0402 (1005M) Capacitor)
pins: 1, 2

## CC0402KRX7R7BB471
designator C?  Capacitance: 470pF  (hidden comment: *)
Capacitor, Ceramic (MLCC), 470pF, ±10%, 16V, X7R, ±10%, SMD 0402; Manufacturer: YAGEO; Manufacturer Part Number: CC0402KRX7R7BB471; Package Size: 0402; JLCPCB Basic Part: No; JLCPCB Part Number: C541379; Supplier 1: LCSC; Category: Capacitors - MLCC; Supplier Part Number 1: C541379; Tolerance: ±10%; Voltage Rating: 16V; Temperature Coefficient: X7R; RoHS: Yes; ComponentLink1Description: Datasheet; ComponentLink1URL: https://wmsc.lcsc.com/wmsc/upload/file/pdf/v2/lcsc/2006151112_YAGEO-CC0402KRX7R7BB471_C541379.pdf; ComponentLink2Description: JLCPCB Part URL; ComponentLink2URL: https://jlcpcb.com/partdetail/C541379; ComponentLink3Description: LCSC Part URL; ComponentLink3URL: https://lcsc.com/product-detail/Multilayer-Ceramic-Capacitors-MLCC---SMD-SMT_YAGEO-YAGEO-CC0402KRX7R7BB471_C541379.html
footprint CAP-0402 (0402 (1005M) Capacitor)
pins: 1, 2

## CC0402KRX7R7BB472
designator C?  Capacitance: 4.7nF  (hidden comment: *)
Capacitor, Ceramic (MLCC), 4.7nF, ±10%, 16V, X7R, ±10%, SMD 0402; Manufacturer: YAGEO; Manufacturer Part Number: CC0402KRX7R7BB472; Package Size: 0402; JLCPCB Basic Part: No; JLCPCB Part Number: C541380; Supplier 1: LCSC; Category: Capacitors - MLCC; Supplier Part Number 1: C541380; Tolerance: ±10%; Voltage Rating: 16V; Temperature Coefficient: X7R; RoHS: Yes; ComponentLink1Description: Datasheet; ComponentLink1URL: https://wmsc.lcsc.com/wmsc/upload/file/pdf/v2/lcsc/2006151112_YAGEO-CC0402KRX7R7BB472_C541380.pdf; ComponentLink2Description: JLCPCB Part URL; ComponentLink2URL: https://jlcpcb.com/partdetail/C541380; ComponentLink3Description: LCSC Part URL; ComponentLink3URL: https://lcsc.com/product-detail/Multilayer-Ceramic-Capacitors-MLCC---SMD-SMT_YAGEO-YAGEO-CC0402KRX7R7BB472_C541380.html
footprint CAP-0402 (0402 (1005M) Capacitor)
pins: 1, 2

## CC0402KRX7R7BB473
designator C?  Capacitance: 47nF  (hidden comment: *)
Capacitor, Ceramic (MLCC), 47nF, ±10%, 16V, X7R, ±10%, SMD 0402; Manufacturer: YAGEO; Manufacturer Part Number: CC0402KRX7R7BB473; Package Size: 0402; JLCPCB Basic Part: No; JLCPCB Part Number: C106260; Supplier 1: LCSC; Category: Capacitors - MLCC; Supplier Part Number 1: C106260; Tolerance: ±10%; Voltage Rating: 16V; Temperature Coefficient: X7R; RoHS: Yes; ComponentLink1Description: Datasheet; ComponentLink1URL: https://wmsc.lcsc.com/wmsc/upload/file/pdf/v2/lcsc/2304140030_YAGEO-CC0402KRX7R7BB473_C106260.pdf; ComponentLink2Description: JLCPCB Part URL; ComponentLink2URL: https://jlcpcb.com/partdetail/C106260; ComponentLink3Description: LCSC Part URL; ComponentLink3URL: https://lcsc.com/product-detail/Multilayer-Ceramic-Capacitors-MLCC---SMD-SMT_YAGEO-YAGEO-CC0402KRX7R7BB473_C106260.html
footprint CAP-0402 (0402 (1005M) Capacitor)
pins: 1, 2

## CC0402KRX7R7BB563
designator C?  Capacitance: 56nF  (hidden comment: *)
Capacitor, Ceramic (MLCC), 56nF, ±10%, 16V, X7R, ±10%, SMD 0402; Manufacturer: YAGEO; Manufacturer Part Number: CC0402KRX7R7BB563; Package Size: 0402; JLCPCB Basic Part: No; JLCPCB Part Number: C107018; Supplier 1: LCSC; Category: Capacitors - MLCC; Supplier Part Number 1: C107018; Tolerance: ±10%; Voltage Rating: 16V; Temperature Coefficient: X7R; RoHS: Yes; ComponentLink1Description: Datasheet; ComponentLink1URL: https://wmsc.lcsc.com/wmsc/upload/file/pdf/v2/lcsc/2304140030_YAGEO-CC0402KRX7R7BB563_C107018.pdf; ComponentLink2Description: JLCPCB Part URL; ComponentLink2URL: https://jlcpcb.com/partdetail/C107018; ComponentLink3Description: LCSC Part URL; ComponentLink3URL: https://lcsc.com/product-detail/Multilayer-Ceramic-Capacitors-MLCC---SMD-SMT_YAGEO-YAGEO-CC0402KRX7R7BB563_C107018.html
footprint CAP-0402 (0402 (1005M) Capacitor)
pins: 1, 2

## CC0402KRX7R7BB682
designator C?  Capacitance: 6.8nF  (hidden comment: *)
Capacitor, Ceramic (MLCC), 6.8nF, ±10%, 16V, X7R, ±10%, SMD 0402; Manufacturer: YAGEO; Manufacturer Part Number: CC0402KRX7R7BB682; Package Size: 0402; JLCPCB Basic Part: No; JLCPCB Part Number: C541382; Supplier 1: LCSC; Category: Capacitors - MLCC; Supplier Part Number 1: C541382; Tolerance: ±10%; Voltage Rating: 16V; Temperature Coefficient: X7R; RoHS: Yes; ComponentLink1Description: Datasheet; ComponentLink1URL: https://wmsc.lcsc.com/wmsc/upload/file/pdf/v2/lcsc/2006151112_YAGEO-CC0402KRX7R7BB682_C541382.pdf; ComponentLink2Description: JLCPCB Part URL; ComponentLink2URL: https://jlcpcb.com/partdetail/C541382; ComponentLink3Description: LCSC Part URL; ComponentLink3URL: https://lcsc.com/product-detail/Multilayer-Ceramic-Capacitors-MLCC---SMD-SMT_YAGEO-YAGEO-CC0402KRX7R7BB682_C541382.html
footprint CAP-0402 (0402 (1005M) Capacitor)
pins: 1, 2

## CC0402KRX7R7BB683
designator C?  Capacitance: 68nF  (hidden comment: *)
Capacitor, Ceramic (MLCC), 68nF, ±10%, 16V, X7R, ±10%, SMD 0402; Manufacturer: YAGEO; Manufacturer Part Number: CC0402KRX7R7BB683; Package Size: 0402; JLCPCB Basic Part: No; JLCPCB Part Number: C327019; Supplier 1: LCSC; Category: Capacitors - MLCC; Supplier Part Number 1: C327019; Tolerance: ±10%; Voltage Rating: 16V; Temperature Coefficient: X7R; RoHS: Yes; ComponentLink1Description: Datasheet; ComponentLink1URL: https://wmsc.lcsc.com/wmsc/upload/file/pdf/v2/lcsc/1811141233_YAGEO-CC0402KRX7R7BB683_C327019.pdf; ComponentLink2Description: JLCPCB Part URL; ComponentLink2URL: https://jlcpcb.com/partdetail/C327019; ComponentLink3Description: LCSC Part URL; ComponentLink3URL: https://lcsc.com/product-detail/Multilayer-Ceramic-Capacitors-MLCC---SMD-SMT_YAGEO-YAGEO-CC0402KRX7R7BB683_C327019.html
footprint CAP-0402 (0402 (1005M) Capacitor)
pins: 1, 2

## CC0402KRX7R7BB822
designator C?  Capacitance: 8.2nF  (hidden comment: *)
Capacitor, Ceramic (MLCC), 8.2nF, ±10%, 16V, X7R, ±10%, SMD 0402; Manufacturer: YAGEO; Manufacturer Part Number: CC0402KRX7R7BB822; Package Size: 0402; JLCPCB Basic Part: No; JLCPCB Part Number: C309459; Supplier 1: LCSC; Category: Capacitors - MLCC; Supplier Part Number 1: C309459; Tolerance: ±10%; Voltage Rating: 16V; Temperature Coefficient: X7R; RoHS: Yes; ComponentLink1Description: Datasheet; ComponentLink1URL: https://wmsc.lcsc.com/wmsc/upload/file/pdf/v2/lcsc/2304140030_YAGEO-CC0402KRX7R7BB822_C309459.pdf; ComponentLink2Description: JLCPCB Part URL; ComponentLink2URL: https://jlcpcb.com/partdetail/C309459; ComponentLink3Description: LCSC Part URL; ComponentLink3URL: https://lcsc.com/product-detail/Multilayer-Ceramic-Capacitors-MLCC---SMD-SMT_YAGEO-YAGEO-CC0402KRX7R7BB822_C309459.html
footprint CAP-0402 (0402 (1005M) Capacitor)
pins: 1, 2

## CC0402KRX7R7BB823
designator C?  Capacitance: 82nF  (hidden comment: *)
Capacitor, Ceramic (MLCC), 82nF, ±10%, 16V, X7R, ±10%, SMD 0402; Manufacturer: YAGEO; Manufacturer Part Number: CC0402KRX7R7BB823; Package Size: 0402; JLCPCB Basic Part: No; JLCPCB Part Number: C576735; Supplier 1: LCSC; Category: Capacitors - MLCC; Supplier Part Number 1: C576735; Tolerance: ±10%; Voltage Rating: 16V; Temperature Coefficient: X7R; RoHS: Yes; ComponentLink1Description: Datasheet; ComponentLink1URL: https://wmsc.lcsc.com/wmsc/upload/file/pdf/v2/lcsc/2008071535_YAGEO-CC0402KRX7R7BB823_C576735.pdf; ComponentLink2Description: JLCPCB Part URL; ComponentLink2URL: https://jlcpcb.com/partdetail/C576735; ComponentLink3Description: LCSC Part URL; ComponentLink3URL: https://lcsc.com/product-detail/Multilayer-Ceramic-Capacitors-MLCC---SMD-SMT_YAGEO-YAGEO-CC0402KRX7R7BB823_C576735.html
footprint CAP-0402 (0402 (1005M) Capacitor)
pins: 1, 2

## CC0402KRX7R8BB101
designator C?  Capacitance: 100pF  (hidden comment: *)
Capacitor, Ceramic (MLCC), 100pF, ±10%, 25V, X7R, ±10%, SMD 0402; Manufacturer: YAGEO; Manufacturer Part Number: CC0402KRX7R8BB101; Package Size: 0402; JLCPCB Basic Part: No; JLCPCB Part Number: C541383; Supplier 1: LCSC; Category: Capacitors - MLCC; Supplier Part Number 1: C541383; Tolerance: ±10%; Voltage Rating: 25V; Temperature Coefficient: X7R; RoHS: Yes; ComponentLink1Description: Datasheet; ComponentLink1URL: https://wmsc.lcsc.com/wmsc/upload/file/pdf/v2/lcsc/2006151112_YAGEO-CC0402KRX7R8BB101_C541383.pdf; ComponentLink2Description: JLCPCB Part URL; ComponentLink2URL: https://jlcpcb.com/partdetail/C541383; ComponentLink3Description: LCSC Part URL; ComponentLink3URL: https://lcsc.com/product-detail/Multilayer-Ceramic-Capacitors-MLCC---SMD-SMT_YAGEO-YAGEO-CC0402KRX7R8BB101_C541383.html
footprint CAP-0402 (0402 (1005M) Capacitor)
pins: 1, 2

## CC0402KRX7R8BB102
designator C?  Capacitance: 1nF  (hidden comment: *)
Capacitor, Ceramic (MLCC), 1nF, ±10%, 25V, X7R, ±10%, SMD 0402; Manufacturer: YAGEO; Manufacturer Part Number: CC0402KRX7R8BB102; Package Size: 0402; JLCPCB Basic Part: No; JLCPCB Part Number: C541372; Supplier 1: LCSC; Category: Capacitors - MLCC; Supplier Part Number 1: C541372; Tolerance: ±10%; Voltage Rating: 25V; Temperature Coefficient: X7R; RoHS: Yes; ComponentLink1Description: Datasheet; ComponentLink1URL: https://wmsc.lcsc.com/wmsc/upload/file/pdf/v2/lcsc/2006151112_YAGEO-CC0402KRX7R8BB102_C541372.pdf; ComponentLink2Description: JLCPCB Part URL; ComponentLink2URL: https://jlcpcb.com/partdetail/C541372; ComponentLink3Description: LCSC Part URL; ComponentLink3URL: https://lcsc.com/product-detail/Multilayer-Ceramic-Capacitors-MLCC---SMD-SMT_YAGEO-YAGEO-CC0402KRX7R8BB102_C541372.html
footprint CAP-0402 (0402 (1005M) Capacitor)
pins: 1, 2

## CC0402KRX7R8BB103
designator C?  Capacitance: 10nF  (hidden comment: *)
Capacitor, Ceramic (MLCC), 10nF, ±10%, 25V, X7R, ±10%, SMD 0402; Manufacturer: YAGEO; Manufacturer Part Number: CC0402KRX7R8BB103; Package Size: 0402; JLCPCB Basic Part: No; JLCPCB Part Number: C327025; Supplier 1: LCSC; Category: Capacitors - MLCC; Supplier Part Number 1: C327025; Tolerance: ±10%; Voltage Rating: 25V; Temperature Coefficient: X7R; RoHS: Yes; ComponentLink1Description: Datasheet; ComponentLink1URL: https://wmsc.lcsc.com/wmsc/upload/file/pdf/v2/lcsc/1811141228_YAGEO-CC0402KRX7R8BB103_C327025.pdf; ComponentLink2Description: JLCPCB Part URL; ComponentLink2URL: https://jlcpcb.com/partdetail/C327025; ComponentLink3Description: LCSC Part URL; ComponentLink3URL: https://lcsc.com/product-detail/Multilayer-Ceramic-Capacitors-MLCC---SMD-SMT_YAGEO-YAGEO-CC0402KRX7R8BB103_C327025.html
footprint CAP-0402 (0402 (1005M) Capacitor)
pins: 1, 2

## CC0402KRX7R8BB104
designator C?  Capacitance: 100nF  (hidden comment: *)
Capacitor, Ceramic (MLCC), 100nF, ±10%, 25V, X7R, ±10%, SMD 0402; Manufacturer: YAGEO; Manufacturer Part Number: CC0402KRX7R8BB104; Package Size: 0402; JLCPCB Basic Part: No; JLCPCB Part Number: C105883; Supplier 1: LCSC; Category: Capacitors - MLCC; Supplier Part Number 1: C105883; Tolerance: ±10%; Voltage Rating: 25V; Temperature Coefficient: X7R; RoHS: Yes; ComponentLink1Description: Datasheet; ComponentLink1URL: https://wmsc.lcsc.com/wmsc/upload/file/pdf/v2/lcsc/2304140030_YAGEO-CC0402KRX7R8BB104_C105883.pdf; ComponentLink2Description: JLCPCB Part URL; ComponentLink2URL: https://jlcpcb.com/partdetail/C105883; ComponentLink3Description: LCSC Part URL; ComponentLink3URL: https://lcsc.com/product-detail/Multilayer-Ceramic-Capacitors-MLCC---SMD-SMT_YAGEO-YAGEO-CC0402KRX7R8BB104_C105883.html
footprint CAP-0402 (0402 (1005M) Capacitor)
pins: 1, 2

## CC0402KRX7R8BB123
designator C?  Capacitance: 12nF  (hidden comment: *)
Capacitor, Ceramic (MLCC), 12nF, ±10%, 25V, X7R, ±10%, SMD 0402; Manufacturer: YAGEO; Manufacturer Part Number: CC0402KRX7R8BB123; Package Size: 0402; JLCPCB Basic Part: No; JLCPCB Part Number: C113786; Supplier 1: LCSC; Category: Capacitors - MLCC; Supplier Part Number 1: C113786; Tolerance: ±10%; Voltage Rating: 25V; Temperature Coefficient: X7R; RoHS: Yes; ComponentLink1Description: Datasheet; ComponentLink1URL: https://wmsc.lcsc.com/wmsc/upload/file/pdf/v2/lcsc/2304140030_YAGEO-CC0402KRX7R8BB123_C113786.pdf; ComponentLink2Description: JLCPCB Part URL; ComponentLink2URL: https://jlcpcb.com/partdetail/C113786; ComponentLink3Description: LCSC Part URL; ComponentLink3URL: https://lcsc.com/product-detail/Multilayer-Ceramic-Capacitors-MLCC---SMD-SMT_YAGEO-YAGEO-CC0402KRX7R8BB123_C113786.html
footprint CAP-0402 (0402 (1005M) Capacitor)
pins: 1, 2
